# Altium footprint library PcbLib1.PcbLib: 17 footprints (part 2 of 2)
Each footprint in its own frame and in the unit in brackets; x right, y up, seen from the top. Pads: shape width x height; smd on the part's side, far side on the other; paste and mask are expansions set on the pad; w line width, h text height; cw(c..) or ccw(c..) is an arc to the next point about the centre after c.
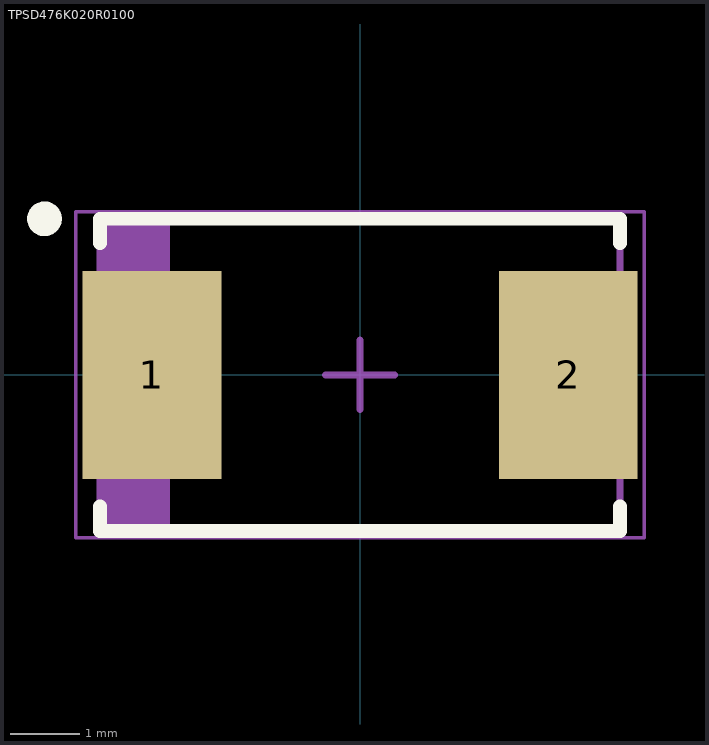
[diagram p1: the footprint, top view; thin cyan lines are the x and y axes]

## TPSD476K020R0100 [mm] "Molded Capacitor, 2-Leads, Body 7.50x4.5mm"
height 3.1
pads (2):
  rect 2x3 smd: 1(-3,0) 2(3,0)
Top Overlay:
  circle w0.25: c-4.55,2.25 r0.125
  lines w0.2: -3.75,-1.9 -3.75,-2.25 3.75,-2.25 3.75,-1.9 ; -3.75,1.9 -3.75,2.25 3.75,2.25 3.75,1.9
Mechanical 13:
  region: -2.741,2.25 -3.75,2.25 -3.75,-2.25 -2.741,-2.25
  lines w0.1: -3.75,-2.25 -3.75,2.25 3.75,2.25 3.75,-2.25 -3.75,-2.25
Mechanical 15:
  lines w0.05: -4.1,-2.35 -4.1,2.35 4.1,2.35 4.1,-2.35 -4.1,-2.35
  lines w0.1: -0.5,0 0.5,0 ; 0,-0.5 0,0.5
3D body "CAPMP7344X31L.step": height 3.1, standoff 0, extent -3.97,-2.25 3.97,2.25